# Altium footprint library Flight_controller v1.0.PcbLib: 98 footprints (part 6 of 7)
Each footprint in its own frame and in the unit in brackets; x right, y up, seen from the top. Pads: shape width x height; smd on the part's side, far side on the other; paste and mask are expansions set on the pad; w line width, h text height; cw(c..) or ccw(c..) is an arc to the next point about the centre after c.
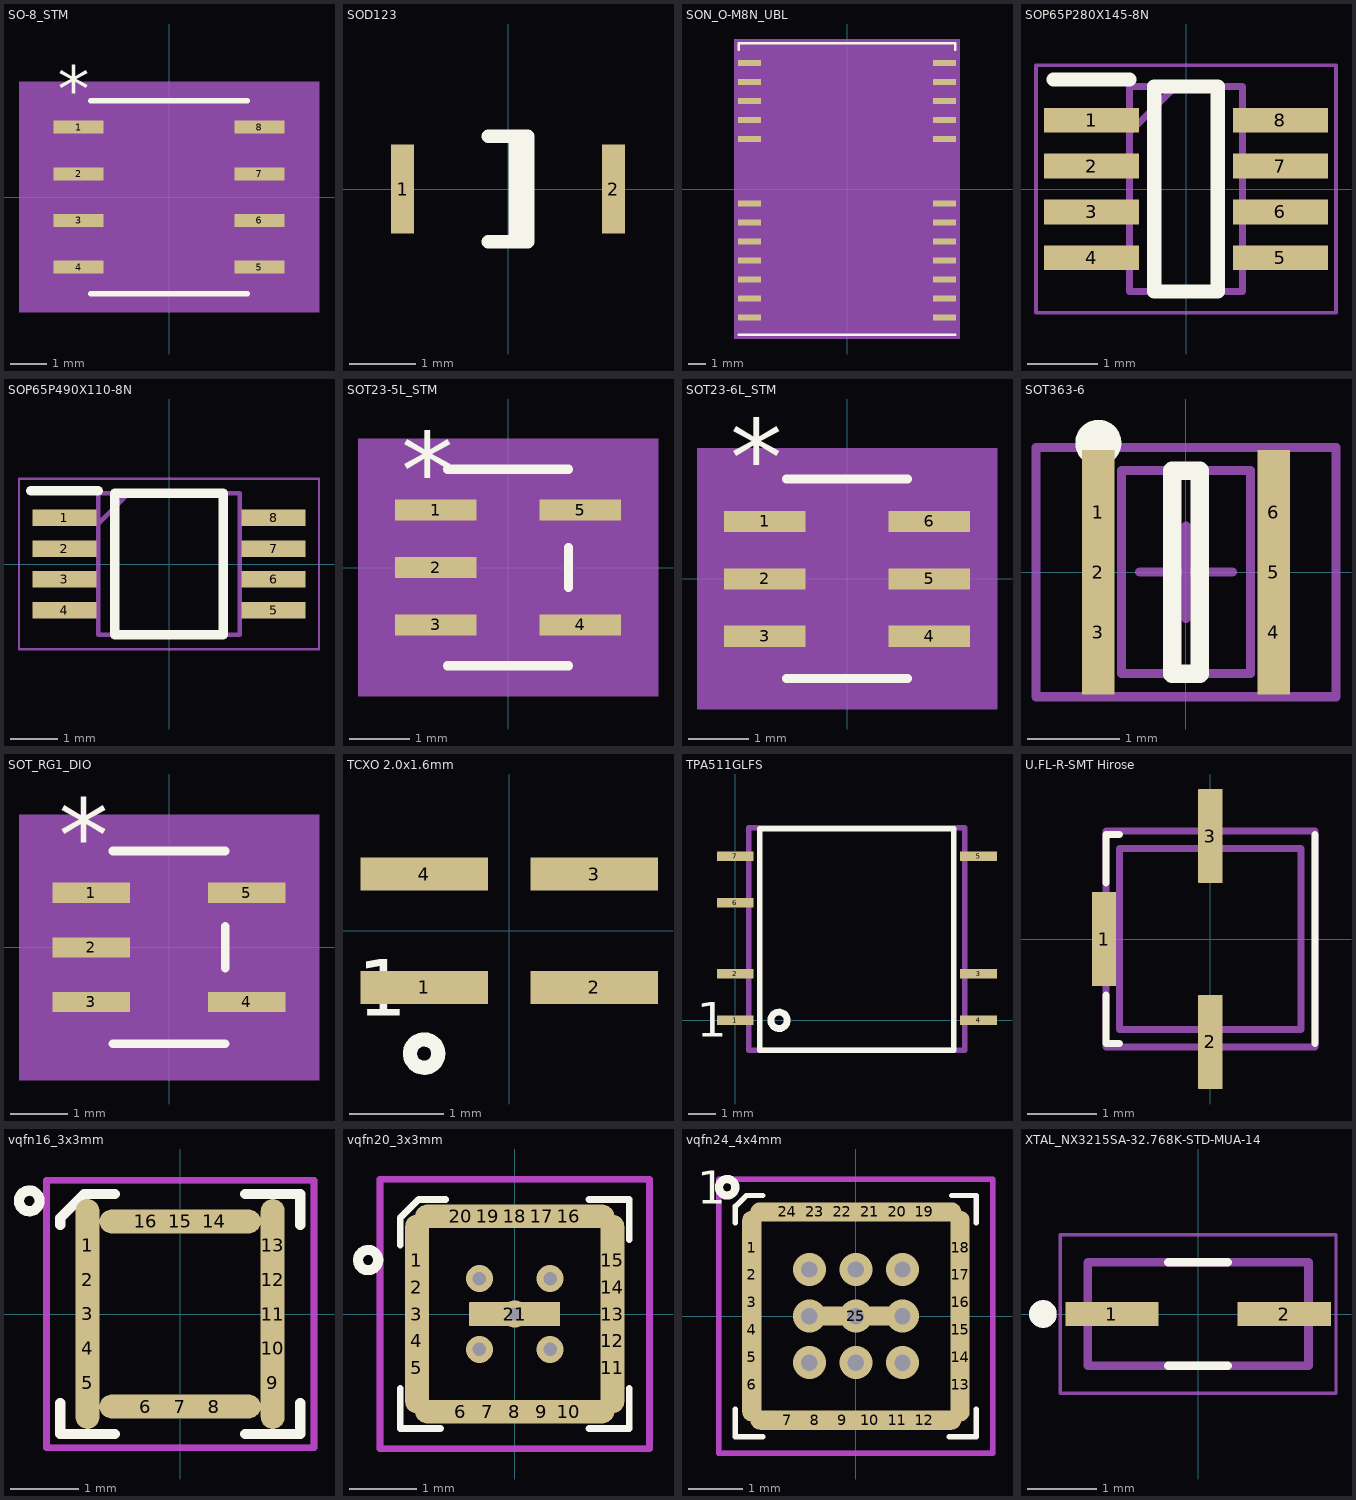
[diagram p5: the footprints below, top view; thin cyan lines are the x and y axes]

## SO-8_STM [mm]
pads (8):
  rect 1.35x0.35 smd paste+0.05 mask+0.05: 1(-2.464,1.905) 2(-2.464,0.635) 3(-2.464,-0.635) 4(-2.464,-1.905) 5(2.464,-1.905) 6(2.464,-0.635) 7(2.464,0.635) 8(2.464,1.905)
Top Overlay:
  lines w0.152: -2.134,-2.629 2.134,-2.629 ; -2.134,2.629 2.134,2.629
  text "*" at -3.035,2.311 h1.27
Mechanical 5:
  region: 4.084,-3.137 -4.084,-3.137 -4.084,3.137 4.084,3.137
Mechanical 13:
  lines w0: -0.305,2.502 ccw(c0,2.502) 0.305,2.502
  lines w0.025: -3.099,-2.146 -3.099,-1.664 -2.007,-1.664 -2.007,-2.146 -3.099,-2.146 ; -3.099,-0.876 -3.099,-0.394 -2.007,-0.394 -2.007,-0.876 -3.099,-0.876 ; -3.099,0.394 -3.099,0.876 -2.007,0.876 -2.007,0.394 -3.099,0.394 ; -3.099,1.664 -3.099,2.146 -2.007,2.146 -2.007,1.664 -3.099,1.664 ; -2.007,-2.502 2.007,-2.502 2.007,2.502 -2.007,2.502 -2.007,-2.502 ; 2.007,-2.146 2.007,-1.664 3.099,-1.664 3.099,-2.146 2.007,-2.146 ; 2.007,-0.876 2.007,-0.394 3.099,-0.394 3.099,-0.876 2.007,-0.876 ; 2.007,0.394 2.007,0.876 3.099,0.876 3.099,0.394 2.007,0.394 ; 2.007,1.664 2.007,2.146 3.099,2.146 3.099,1.664 2.007,1.664
  text "*" at -1.943,1.156 h1.27
Mechanical 15:
  region: -2.261,-2.425 -3.703,-2.425 -3.703,2.425 -2.261,2.425 -2.261,2.756 2.261,2.756 2.261,2.425 3.703,2.425 3.703,-2.425 2.261,-2.425 2.261,-2.756 -2.261,-2.756
  lines w0.152: -3.703,-2.425 -3.703,2.425 -2.261,2.425 -2.261,2.756 2.261,2.756 2.261,2.425 3.703,2.425 3.703,-2.425 2.261,-2.425 2.261,-2.756 -2.261,-2.756 -2.261,-2.425 -3.703,-2.425
3D body "SO-8_STM.step": height 1.76, standoff 0, extent -3.099,-2.502 3.099,2.502

## SOD123 [mm] "SOD123; Chip Diode; Body  2.7 x 1.6 mm (LxW typ)"
height 1.35
pads (2):
  rect 0.35x1.35 smd paste+0.05 mask+0.05: 1(-1.6,0) 2(1.6,0)
Top Overlay:
  lines w0.2: -0.3,-0.8 0.3,-0.8 0.3,0.8 -0.3,0.8 ; 0.11,-0.8 0.11,0.8

## SON_O-M8N_UBL [mm]
pads (24):
  rect 1.35x0.35 smd paste+0.05 mask+0.05: 1(5.65,-7.433) 2(5.65,-6.333) 3(5.65,-5.233) 4(5.65,-4.133) 5(5.65,-3.033) 6(5.65,-1.933) 7(5.65,-0.833) 8(5.65,2.906) 9(5.65,4.006) 10(5.65,5.106) 11(5.65,6.206) 12(5.65,7.306) 13(-5.65,7.306) 14(-5.65,6.206) 15(-5.65,5.106) 16(-5.65,4.006) 17(-5.65,2.906) 18(-5.65,-0.833) 19(-5.65,-1.933) 20(-5.65,-3.033) 21(-5.65,-4.133) 22(-5.65,-5.233) 23(-5.65,-6.333) 24(-5.65,-7.433)
Top Overlay:
  lines w0.152: -6.274,-8.433 6.274,-8.433 ; -6.274,8.057 -6.274,8.433 6.274,8.433 6.274,8.057
Mechanical 5:
  region: 6.526,-8.687 -6.526,-8.687 -6.526,8.687 6.526,8.687
Mechanical 13:
  lines w0: -0.305,8.306 ccw(c0,8.306) 0.305,8.306
  lines w0.025: -6.147,-8.306 -6.147,8.306 6.147,8.306 6.147,-8.306 -6.147,-8.306
Mechanical 15:
  region: -6.401,-6.749 -6.401,6.749 -6.401,8.56 6.401,8.56 6.401,6.749 6.401,-6.749 6.401,-8.56 -6.401,-8.56
  lines w0.152: -6.401,-8.56 6.401,-8.56 6.401,-6.749 6.401,6.749 6.401,8.56 -6.401,8.56 -6.401,6.749 -6.401,-6.749 -6.401,-8.56
3D body: height 0.25, standoff 0, extent 0,0 0.254,0.254

## SOP65P280X145-8N [mm]
pads (8):
  rect 1.35x0.35 smd paste+0.05 mask+0.05: 1(-1.338,0.975) 2(-1.338,0.325) 3(-1.338,-0.325) 4(-1.338,-0.975) 5(1.338,-0.975) 6(1.338,-0.325) 7(1.338,0.325) 8(1.338,0.975)
Top Overlay:
  lines w0.2: -1.875,1.55 -0.8,1.55 ; -0.45,-1.45 -0.45,1.45 0.45,1.45 0.45,-1.45 -0.45,-1.45
Mechanical 13:
  lines w0.1: -0.8,0.8 -0.15,1.45 ; -0.8,-1.45 -0.8,1.45 0.8,1.45 0.8,-1.45 -0.8,-1.45
Mechanical 15:
  lines w0.05: -2.125,-1.75 -2.125,1.75 2.125,1.75 2.125,-1.75 -2.125,-1.75
3D body "INA219AIDCNR.stp": height 1.45, standoff 0, extent -1.4,-1.45 1.4,1.45

## SOP65P490X110-8N [mm]
pads (8):
  rect 1.35x0.35 smd paste+0.05 mask+0.05: 1(-2.212,0.975) 2(-2.212,0.325) 3(-2.212,-0.325) 4(-2.212,-0.975) 5(2.212,-0.975) 6(2.212,-0.325) 7(2.212,0.325) 8(2.212,0.975)
Top Overlay:
  lines w0.2: -2.925,1.55 -1.5,1.55 ; -1.15,-1.5 1.15,-1.5 1.15,1.5 -1.15,1.5 -1.15,-1.5
Mechanical 13:
  lines w0.1: -1.5,0.85 -0.85,1.5 ; -1.5,-1.5 1.5,-1.5 1.5,1.5 -1.5,1.5 -1.5,-1.5
Mechanical 15:
  lines w0.05: -3.175,-1.801 3.175,-1.801 3.175,1.801 -3.175,1.801 -3.175,-1.801
3D body "LT1962EMS8-3#PBF.stp": height 1.1, standoff 0, extent -2.45,-1.5 2.45,1.5

## SOT23-5L_STM [mm]
pads (5):
  rect 1.35x0.35 smd paste+0.05 mask+0.05: 1(-1.194,0.95) 2(-1.194,0) 3(-1.194,-0.95) 4(1.194,-0.95) 5(1.194,0.95)
Top Overlay:
  lines w0.152: -1.003,-1.626 1.003,-1.626 ; -1.003,1.626 1.003,1.626 ; 1.003,-0.333 1.003,0.333
  text "*" at -1.765,0.98 h1.27
Mechanical 5:
  region: 2.484,-2.134 2.484,2.134 -2.484,2.134 -2.484,-2.134
Mechanical 13:
  lines w0.025: -1.499,-1.204 -1.499,-0.696 -0.876,-0.696 -0.876,-1.204 -1.499,-1.204 ; -1.499,-0.254 -1.499,0.254 -0.876,0.254 -0.876,-0.254 -1.499,-0.254 ; -1.499,0.696 -1.499,1.204 -0.876,1.204 -0.876,0.696 -1.499,0.696 ; -0.876,-1.499 0.876,-1.499 0.876,1.499 -0.876,1.499 -0.876,-1.499 ; 0.876,-1.204 0.876,-0.696 1.499,-0.696 1.499,-1.204 0.876,-1.204 ; 0.876,0.696 0.876,1.204 1.499,1.204 1.499,0.696 0.876,0.696
  text "*" at -0.94,0.472 h1.27
Mechanical 15:
  region: 1.13,-1.753 -1.13,-1.753 -1.13,-1.488 -2.134,-1.488 -2.134,1.488 -1.13,1.488 -1.13,1.753 1.13,1.753 1.13,1.488 2.134,1.488 2.134,-1.488 1.13,-1.488
  lines w0.152: -2.134,-1.488 -1.13,-1.488 -1.13,-1.753 1.13,-1.753 1.13,-1.488 2.134,-1.488 2.134,1.488 1.13,1.488 1.13,1.753 -1.13,1.753 -1.13,1.488 -2.134,1.488 -2.134,-1.488
3D body "SOT23-5L_STM.step": height 1.45, standoff 0, extent -1.499,-1.499 1.499,1.499

## SOT23-6L_STM [mm]
pads (6):
  rect 1.35x0.35 smd paste+0.05 mask+0.05: 1(-1.362,0.95) 2(-1.362,0) 3(-1.362,-0.95) 4(1.362,-0.95) 5(1.362,0) 6(1.362,0.95)
Top Overlay:
  lines w0.152: -1.003,-1.651 1.003,-1.651 ; -1.003,1.651 1.003,1.651
  text "*" at -1.934,1.381 h1.27
Mechanical 5:
  region: 2.484,-2.159 -2.484,-2.159 -2.484,2.159 2.484,2.159
Mechanical 13:
  lines w0: -0.305,1.524 ccw(c0,1.524) 0.305,1.524
  lines w0.025: -1.499,-1.204 -0.876,-1.204 -0.876,-0.696 -1.499,-0.696 -1.499,-1.204 ; -1.499,-0.254 -0.876,-0.254 -0.876,0.254 -1.499,0.254 -1.499,-0.254 ; -1.499,0.696 -0.876,0.696 -0.876,1.204 -1.499,1.204 -1.499,0.696 ; -0.876,-1.524 -0.876,1.524 0.876,1.524 0.876,-1.524 -0.876,-1.524 ; 0.876,-1.204 1.499,-1.204 1.499,-0.696 0.876,-0.696 0.876,-1.204 ; 0.876,-0.254 1.499,-0.254 1.499,0.254 0.876,0.254 0.876,-0.254 ; 0.876,0.696 1.499,0.696 1.499,1.204 0.876,1.204 0.876,0.696
  text "*" at -0.813,0.178 h1.27
Mechanical 15:
  region: -1.13,-1.483 -2.103,-1.483 -2.103,1.483 -1.13,1.483 -1.13,1.778 1.13,1.778 1.13,1.483 2.103,1.483 2.103,-1.483 1.13,-1.483 1.13,-1.778 -1.13,-1.778
  lines w0.152: -2.103,-1.483 -1.13,-1.483 -1.13,-1.778 1.13,-1.778 1.13,-1.483 2.103,-1.483 2.103,1.483 1.13,1.483 1.13,1.778 -1.13,1.778 -1.13,1.483 -2.103,1.483 -2.103,-1.483
3D body "SOT23-6L_STM.step": height 1.45, standoff 0, extent -1.499,-1.524 1.499,1.524

## SOT363-6 [mm] "SOT363, 6-Leads, Body 2x1.3mm, Pitch 0.65mm, Lead Span 2.1mm, IPC Medium Density"
height 1
pads (6):
  rect 0.35x1.35 smd paste+0.05 mask+0.05: 1(-0.95,0.65) 2(-0.95,0) 3(-0.95,-0.65) 4(0.95,-0.65) 5(0.95,0) 6(0.95,0.65)
Top Overlay:
  circle w0.25: c-0.95,1.4 r0.125
  lines w0.2: -0.15,-1.1 -0.15,1.1 0.15,1.1 0.15,-1.1 -0.15,-1.1
Mechanical 13:
  lines w0.1: -0.7,-1.1 0.7,-1.1 0.7,1.1 -0.7,1.1 -0.7,-1.1
Mechanical 15:
  lines w0.1: -0.5,0 0.5,0 ; 0,-0.5 0,0.5 ; -1.625,-1.35 1.625,-1.35 1.625,1.35 -1.625,1.35 -1.625,-1.35
3D body: height 1, standoff 0, extent -0.7,-1.1 0.7,1.1

## SOT_RG1_DIO [mm]
pads (5):
  rect 1.35x0.35 smd paste+0.05 mask+0.05: 1(-1.35,0.95) 2(-1.35,0) 3(-1.35,-0.95) 4(1.35,-0.95) 5(1.35,0.95)
Top Overlay:
  lines w0.152: -0.978,-1.676 0.978,-1.676 ; -0.978,1.676 0.978,1.676 ; 0.978,-0.363 0.978,0.363
  text "*" at -1.921,1.331 h1.27
Mechanical 5:
  region: 2.611,-2.311 -2.611,-2.311 -2.611,2.311 2.611,2.311
Mechanical 13:
  lines w0: -0.305,1.549 ccw(c0,1.549) 0.305,1.549
  lines w0.025: -1.499,-1.204 -1.499,-0.696 -0.851,-0.696 -0.851,-1.204 -1.499,-1.204 ; -1.499,-0.254 -1.499,0.254 -0.851,0.254 -0.851,-0.254 -1.499,-0.254 ; -1.499,0.696 -1.499,1.204 -0.851,1.204 -0.851,0.696 -1.499,0.696 ; -0.851,-1.549 0.851,-1.549 0.851,1.549 -0.851,1.549 -0.851,-1.549 ; 0.851,-1.204 0.851,-0.696 1.499,-0.696 1.499,-1.204 0.851,-1.204 ; 0.851,0.696 0.851,1.204 1.499,1.204 1.499,0.696 0.851,0.696
  text "*" at -0.914,0.239 h1.27
Mechanical 15:
  region: 1.232,-1.93 -1.232,-1.93 -1.232,-1.458 -2.134,-1.458 -2.134,1.458 -1.232,1.458 -1.232,1.93 1.232,1.93 1.232,1.458 2.134,1.458 2.134,-1.458 1.232,-1.458
  lines w0.152: -2.134,-1.458 -1.232,-1.458 -1.232,-1.93 1.232,-1.93 1.232,-1.458 2.134,-1.458 2.134,1.458 1.232,1.458 1.232,1.93 -1.232,1.93 -1.232,1.458 -2.134,1.458 -2.134,-1.458
3D body "SOT_RG1_DIO.step": height 1.3, standoff 0, extent -1.499,-1.549 1.499,1.549

## TCXO 2.0x1.6mm [mm] "SMD 2.0x1.6mm for TCXO or VCTCXO"
height 1
pads (4):
  rect 1.35x0.35 smd paste+0.05 mask+0.05: 1(-0.9,-0.6) 2(0.9,-0.6) 3(0.9,0.6) 4(-0.9,0.6)
Top Overlay:
  circle w0.15: c-0.9,-1.3 r0.15
  text "1" at -1.6,-0.9 h0.6
3D body: height 1, standoff 0, extent -1,-0.8 1,0.8

## TPA511GLFS [mm] "Joystick; TPA511GLFS; TPA Series; C&K Components"
height 1.45
pads (7):
  rect 1.35x0.35 smd paste+0.05 mask+0.05: 1(0,0) 2(0,1.7) 3(8.9,1.7) 4(8.9,0) 5(8.9,6) 6(0,4.3) 7(0,6)
Top Overlay:
  circle w0.25: c1.6,0 r0.3
  lines w0.2: 0.9,-1.1 0.9,7 8,7 8,-1.1 0.9,-1.1
  text "1" at -1.4,-0.6 h1.27
Mechanical 15:
  lines w0.2: 0.5,-1.1 0.5,7.05 8.4,7.05 8.4,-1.1 0.5,-1.1
3D body: height 2.95, standoff 0, extent 0.4,-1.1 8.5,7.05

## U.FL-R-SMT Hirose [mm] "Hirose U.FL RF receptacle - U.FL-R-SMT"
height 1.2
pads (3):
  rrect5% 0.35x1.35 smd paste+0.05 mask+0.05: 1(-1.525,0) 2(0,-1.475) 3(0,1.475)
Top Overlay:
  lines w0.1: -1.5,-0.8 -1.5,-1.5 -1.3,-1.5 ; -1.5,0.8 -1.5,1.5 -1.3,1.5 ; 1.5,-1.5 1.5,1.5
Mechanical 13:
  lines w0.1: -1.5,-1.55 -1.5,1.55 1.5,1.55 1.5,-1.55 -1.5,-1.55
Mechanical 15:
  lines w0.1: -1.3,-1.3 -1.3,1.3 1.3,1.3 1.3,-1.3 -1.3,-1.3
3D body: height 16, standoff 1.3, extent -1.5,-1.5 1.5,1.5

## vqfn16_3x3mm [mm] "16 Leads, Body 3.0x3.0mm, Pitch 0.50mm, VQFN16"
height 1
pads (16):
  oval 0.35x1.35 smd paste+0.05 mask+0.05: 1(-1.35,1) 2(-1.35,0.5) 3(-1.35,0) 4(-1.35,-0.5) 5(-1.35,-1) 9(1.35,-1) 10(1.35,-0.5) 11(1.35,0) 12(1.35,0.5) 13(1.35,1)
  oval 1.35x0.35 smd paste+0.05 mask+0.05: 6(-0.5,-1.35) 7(0,-1.35) 8(0.5,-1.35) 14(0.5,1.35) 15(0,1.35) 16(-0.5,1.35)
Top Overlay:
  circle w0.15: c-2.2,1.65 r0.15
  lines w0.15: -1.75,-1.3 -1.75,-1.75 -0.95,-1.75 ; -1.75,1.3 -1.75,1.4 -1.4,1.75 -0.95,1.75 ; 0.95,-1.75 1.75,-1.75 1.75,-1.3 ; 0.95,1.75 1.75,1.75 1.75,1.3
Mechanical 15 keep-out:
  lines w0.1: -1.95,-1.95 1.95,-1.95 1.95,1.95 -1.95,1.95 -1.95,-1.95
3D body: height 1, standoff 0.05, extent -1.5,-1.5 1.5,1.5

## vqfn20_3x3mm [mm] "20 Leads, Body 3.0x3.0mm, Pitch 0.40mm, VQFN20"
height 1
pads (21):
  oval 0.35x1.35 smd paste+0.05 mask+0.05: 1(-1.45,0.8) 2(-1.45,0.4) 3(-1.45,0) 4(-1.45,-0.4) 5(-1.45,-0.8) 11(1.45,-0.8) 12(1.45,-0.4) 13(1.45,0) 14(1.45,0.4) 15(1.45,0.8)
  oval 1.35x0.35 smd paste+0.05 mask+0.05: 6(-0.8,-1.45) 7(-0.4,-1.45) 8(0,-1.45) 9(0.4,-1.45) 10(0.8,-1.45) 16(0.8,1.45) 17(0.4,1.45) 18(0,1.45) 19(-0.4,1.45) 20(-0.8,1.45)
  rrect5% 1.35x0.35 smd paste+0.05 mask+0.05: 21(0,0)
via 0,0 diameter 0.4 hole 0.2
via -0.525,0.525 diameter 0.4 hole 0.2
via -0.525,-0.525 diameter 0.4 hole 0.2
via 0.525,-0.525 diameter 0.4 hole 0.2
via 0.525,0.525 diameter 0.4 hole 0.2
Top Overlay:
  circle w0.15: c-2.175,0.8 r0.15
  lines w0.1: -1.7,-1.1 -1.7,-1.7 -1.1,-1.7 ; -1.7,1.025 -1.7,1.425 -1.425,1.7 -1.025,1.7 ; 1.1,-1.7 1.7,-1.7 1.7,-1.1 ; 1.1,1.7 1.7,1.7 1.7,1.1
Top Paste:
  region: 0.75,-0.25 0.75,0.25 0.275,0.25 0.275,-0.25
  region: -0.75,0.25 -0.75,-0.25 -0.275,-0.25 -0.275,0.25
  region: -0.25,-0.75 0.25,-0.75 0.25,-0.275 -0.25,-0.275
  region: -0.25,0.75 -0.25,0.275 0.25,0.275 0.25,0.75
Mechanical 15 keep-out:
  lines w0.1: -2,-2 2,-2 2,2 -2,2 -2,-2
3D body: height 1, standoff 0.05, extent -1.5,-1.5 1.5,1.5

## vqfn24_4x4mm [mm] "24 Leads, Body 4.0x4.0mm, Pitch 0.50mm, VQFN24"
height 1
pads (25):
  oval 0.35x1.35 smd paste+0.05 mask+0.05: 1(-1.9,1.25) 2(-1.9,0.75) 3(-1.9,0.25) 4(-1.9,-0.25) 5(-1.9,-0.75) 6(-1.9,-1.25) 13(1.9,-1.25) 14(1.9,-0.75) 15(1.9,-0.25) 16(1.9,0.25) 17(1.9,0.75) 18(1.9,1.25)
  oval 1.35x0.35 smd paste+0.05 mask+0.05: 7(-1.25,-1.9) 8(-0.75,-1.9) 9(-0.25,-1.9) 10(0.25,-1.9) 11(0.75,-1.9) 12(1.25,-1.9) 19(1.25,1.9) 20(0.75,1.9) 21(0.25,1.9) 22(-0.25,1.9) 23(-0.75,1.9) 24(-1.25,1.9)
  rrect5% 1.35x0.35 smd paste+0.05 mask+0.05: 25(0,0)
via 0.85,-0.85 diameter 0.6 hole 0.3
via 0.85,0.85 diameter 0.6 hole 0.3
via -0.85,0.85 diameter 0.6 hole 0.3
via 0,0 diameter 0.6 hole 0.3
via -0.85,-0.85 diameter 0.6 hole 0.3
via 0,0.85 diameter 0.6 hole 0.3
via -0.85,0 diameter 0.6 hole 0.3
via 0,-0.85 diameter 0.6 hole 0.3
via 0.85,0 diameter 0.6 hole 0.3
Top Overlay:
  circle w0.15: c-2.35,2.35 r0.15
  lines w0.1: -2.2,-1.7 -2.2,-2.2 -1.7,-2.2 ; -2.2,1.7 -2.2,2 -2,2.2 -1.7,2.2 ; 1.7,-2.2 2.2,-2.2 2.2,-1.7 ; 1.75,2.2 2.2,2.2 2.2,1.7
  text "1" at -2.9,2.05 h0.6
Top Paste:
  region: 0.15,-0.85 0.75,-0.85 0.75,-0.2 0.75,-0.1 0.15,-0.1
  region: 0.15,0.1 0.75,0.1 0.75,0.7 0.75,0.85 0.15,0.85
  region: -0.75,0.1 -0.15,0.1 -0.15,0.7 -0.15,0.85 -0.75,0.85
  region: -0.75,-0.85 -0.15,-0.85 -0.15,-0.1 -0.75,-0.1
Mechanical 15 keep-out:
  lines w0.1: -2.5,-2.5 -2.5,2.5 2.5,2.5 2.5,-2.5 -2.5,-2.5
3D body: height 1, standoff 0.05, extent -2,-2 2,2

## XTAL_NX3215SA-32.768K-STD-MUA-14 [mm]
pads (2):
  rect 1.35x0.35 smd paste+0.05 mask+0.05: 1(-1.25,0) 2(1.25,0)
Top Overlay:
  circle w0.2: c-2.25,0 r0.1
  lines w0.127: -0.43,-0.75 0.43,-0.75 ; -0.43,0.75 0.43,0.75
Mechanical 13:
  circle w0.2: c-2.25,0 r0.1
  lines w0.127: -1.6,-0.75 -1.6,0.75 1.6,0.75 1.6,-0.75 -1.6,-0.75
Mechanical 15:
  lines w0.05: -2,-1.15 -2,1.15 2,1.15 2,-1.15 -2,-1.15